# Altium footprint library aiskylab-01Resistors.PcbLib: 208 footprints (part 13 of 13)
Each footprint in its own frame and in the unit in brackets; x right, y up, seen from the top. Pads: shape width x height; smd on the part's side, far side on the other; paste and mask are expansions set on the pad; w line width, h text height; cw(c..) or ccw(c..) is an arc to the next point about the centre after c.
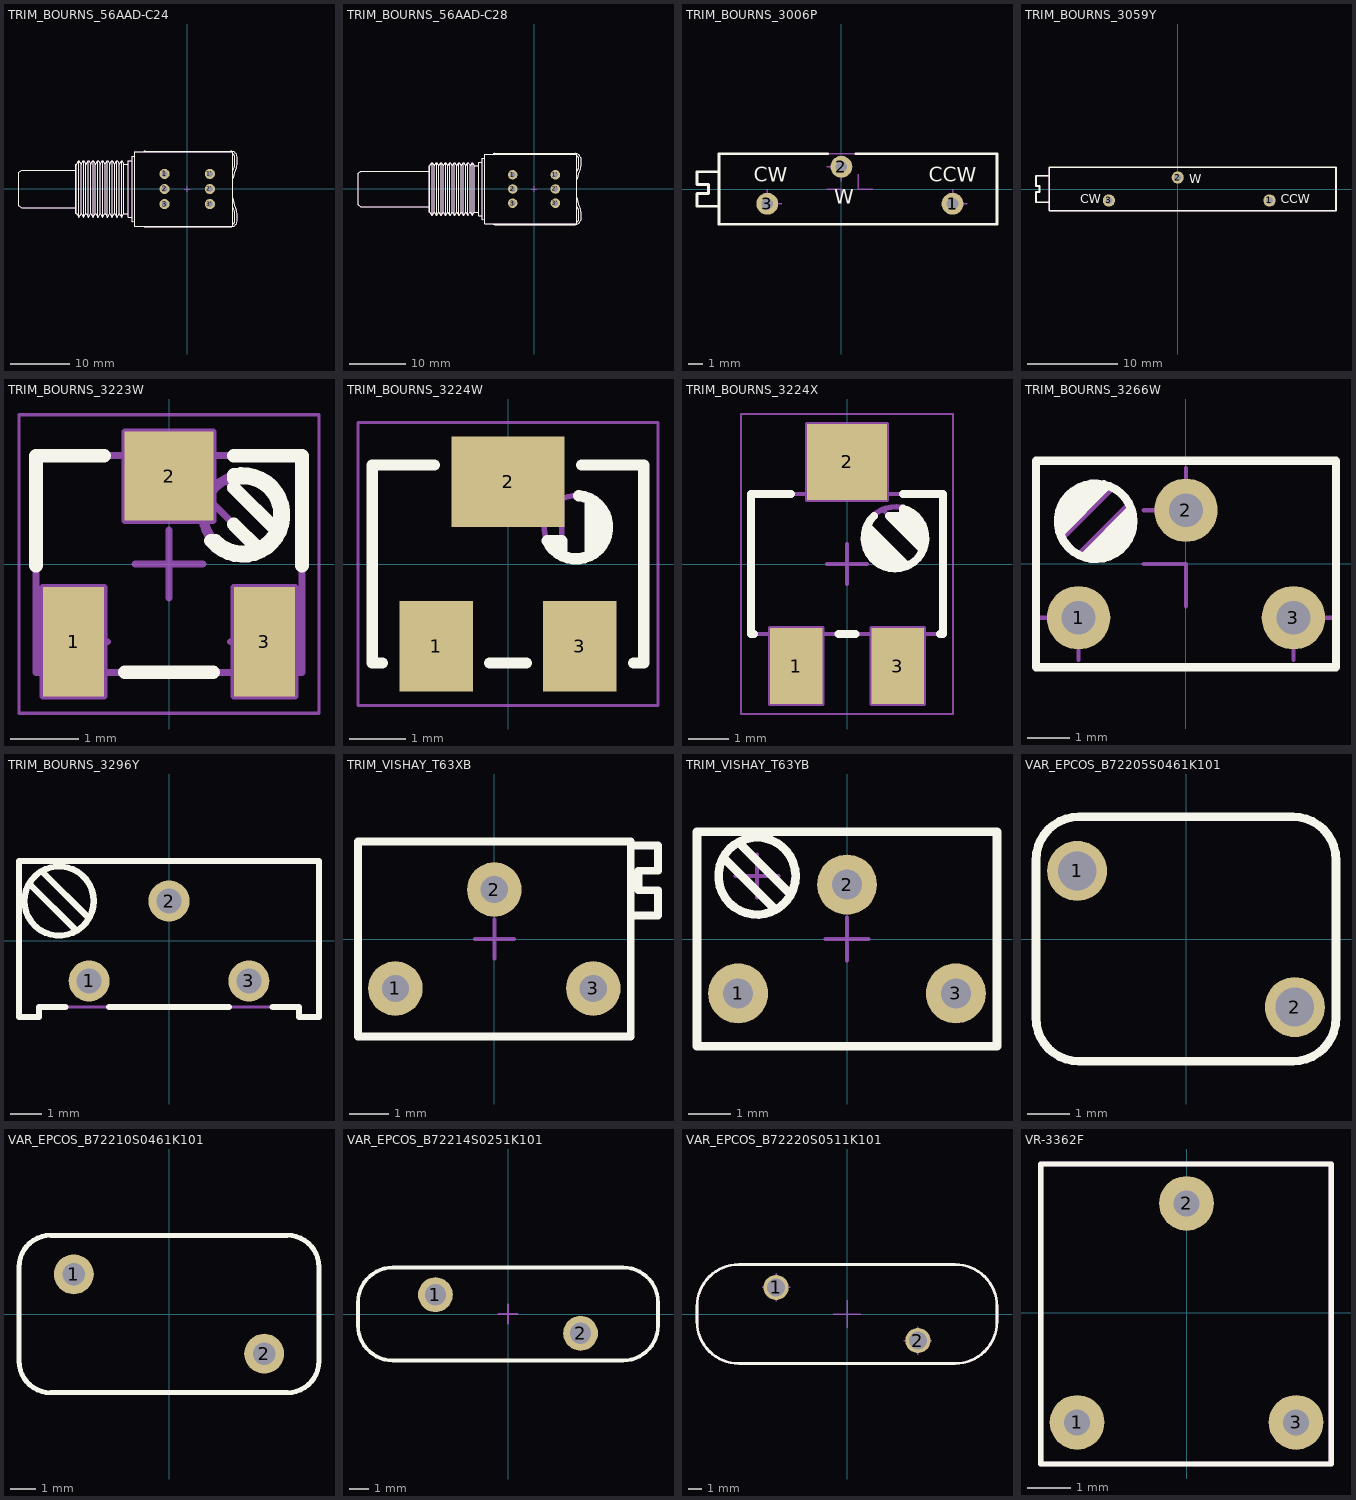
[diagram p12: the footprints below, top view; thin cyan lines are the x and y axes]

## TRIM_BOURNS_56AAD-C24 [mm] "Panel Control Trimming Potentiometer with Rotary (Clock Wise) SPDT Switch, Serie 56"
height 13.25
pads (6):
  round 1.7 hole 1: 1(-3.81,2.54) 1'(3.81,2.54) 2(-3.81,0) 2'(3.81,0) 3(-3.81,-2.54) 3'(3.81,-2.54)
Top Overlay:
  lines w0.2: -18.773,-4.125 -18.773,4.125 ; -18.653,-4.125 -18.603,-4.125 -18.253,-4.725 -18.203,-4.725 -17.853,-4.125 -17.803,-4.125 -17.453,-4.725 -17.403,-4.725 -17.053,-4.125 -17.003,-4.125 -16.653,-4.725 -16.603,-4.725 -16.253,-4.125 -16.203,-4.125 -15.853,-4.725 -15.803,-4.725 -15.453,-4.125 -15.403,-4.125 -15.053,-4.725 -15.003,-4.725 -14.653,-4.125 -14.603,-4.125 -14.253,-4.725 -14.203,-4.725 -13.853,-4.125 -13.803,-4.125 -13.453,-4.725 -13.403,-4.725 -13.053,-4.125 -13.003,-4.125 -12.653,-4.725 -12.603,-4.725 -12.253,-4.125 -12.203,-4.125 -11.853,-4.725 -11.803,-4.725 -11.453,-4.125 -11.403,-4.125 -11.053,-4.725 -11.003,-4.725 -10.653,-4.125 ; -18.653,4.125 -18.603,4.125 -18.253,4.725 -18.203,4.725 -17.853,4.125 -17.803,4.125 -17.453,4.725 -17.403,4.725 -17.053,4.125 -17.003,4.125 -16.653,4.725 -16.603,4.725 -16.253,4.125 -16.203,4.125 -15.853,4.725 -15.803,4.725 -15.453,4.125 -15.403,4.125 -15.053,4.725 -15.003,4.725 -14.653,4.125 -14.603,4.125 -14.253,4.725 -14.203,4.725 -13.853,4.125 -13.803,4.125 -13.453,4.725 -13.403,4.725 -13.053,4.125 -13.003,4.125 -12.653,4.725 -12.603,4.725 -12.253,4.125 -12.203,4.125 -11.853,4.725 -11.803,4.725 -11.453,4.125 -11.403,4.125 -11.053,4.725 -11.003,4.725 -10.653,4.125 ; -18.628,-4.125 -18.628,4.125 ; -18.228,-4.725 -18.228,4.725 ; -17.828,-4.125 -17.828,4.125 ; -17.428,-4.725 -17.428,4.725 ; -17.028,-4.125 -17.028,4.125 ; -16.628,-4.725 -16.628,4.725 ; -16.228,-4.125 -16.228,4.125 ; -15.828,-4.725 -15.828,4.725 ; -15.428,-4.125 -15.428,4.125 ; -15.028,-4.725 -15.028,4.725 ; -14.628,-4.125 -14.628,4.125 ; -14.228,-4.725 -14.228,4.725 ; -13.828,-4.125 -13.828,4.125 ; -13.428,-4.725 -13.428,4.725 ; -13.028,-4.125 -13.028,4.125 ; -12.628,-4.725 -12.628,4.725 ; -12.228,-4.125 -12.228,4.125 ; -11.828,-4.725 -11.828,4.725 ; -11.428,-4.125 -11.428,4.125 ; -11.028,-4.725 -11.028,4.725 ; -9.891,-4.178 -10.653,-4.178 -10.653,4.178 -9.891,4.178 ; -9.256,-4.763 -9.891,-4.763 -9.891,4.762 -9.256,4.762 ; -8.837,-5.447 -9.243,-5.512 -9.243,5.512 -8.837,5.512 ; -7.33,-6.248 ccw(c-7.052,-5.918) -7.052,-6.35 7.354,-6.35 ccw(c7.354,-5.294) 8.41,-5.294 8.41,-4.315 ccw(c6.53,-4.315) 8.246,-3.547 cw(c14.706,-0.656) 7.733,-1.87 7.673,-1.524 ; -7.33,6.248 cw(c-7.052,5.918) -7.052,6.35 7.354,6.35 cw(c7.354,5.294) 8.41,5.294 8.41,4.315 cw(c6.53,4.315) 8.246,3.547 ccw(c14.706,0.656) 7.733,1.87 7.673,1.524 ; 7.673,-5.889 ccw(c7.354,-5.294) 8.029,-5.294 8.029,-4.315 ccw(c6.53,-4.315) 7.898,-3.702 cw(c14.706,-0.656) 7.673,-3.14 ; 7.673,3.14 cw(c14.706,0.656) 7.898,3.702 ccw(c6.53,4.315) 8.029,4.315 8.029,5.294 ccw(c7.354,5.294) 7.673,5.889 ; -28.293,-2.821 -28.293,2.821 -27.793,3.175 -18.773,3.175 -18.773,-3.175 -27.793,-3.175 -28.293,-2.821 ; -8.837,-6.248 -8.837,6.248 7.673,6.248 7.673,-6.248 -8.837,-6.248
Top Designator:
  text ".Designator" at -17.559,-0.508 h1.52
Top Assembly:
  lines w0.1: -18.773,-4.125 -18.773,4.125 ; -18.653,-4.125 -18.603,-4.125 -18.253,-4.725 -18.203,-4.725 -17.853,-4.125 -17.803,-4.125 -17.453,-4.725 -17.403,-4.725 -17.053,-4.125 -17.003,-4.125 -16.653,-4.725 -16.603,-4.725 -16.253,-4.125 -16.203,-4.125 -15.853,-4.725 -15.803,-4.725 -15.453,-4.125 -15.403,-4.125 -15.053,-4.725 -15.003,-4.725 -14.653,-4.125 -14.603,-4.125 -14.253,-4.725 -14.203,-4.725 -13.853,-4.125 -13.803,-4.125 -13.453,-4.725 -13.403,-4.725 -13.053,-4.125 -13.003,-4.125 -12.653,-4.725 -12.603,-4.725 -12.253,-4.125 -12.203,-4.125 -11.853,-4.725 -11.803,-4.725 -11.453,-4.125 -11.403,-4.125 -11.053,-4.725 -11.003,-4.725 -10.653,-4.125 ; -18.653,4.125 -18.603,4.125 -18.253,4.725 -18.203,4.725 -17.853,4.125 -17.803,4.125 -17.453,4.725 -17.403,4.725 -17.053,4.125 -17.003,4.125 -16.653,4.725 -16.603,4.725 -16.253,4.125 -16.203,4.125 -15.853,4.725 -15.803,4.725 -15.453,4.125 -15.403,4.125 -15.053,4.725 -15.003,4.725 -14.653,4.125 -14.603,4.125 -14.253,4.725 -14.203,4.725 -13.853,4.125 -13.803,4.125 -13.453,4.725 -13.403,4.725 -13.053,4.125 -13.003,4.125 -12.653,4.725 -12.603,4.725 -12.253,4.125 -12.203,4.125 -11.853,4.725 -11.803,4.725 -11.453,4.125 -11.403,4.125 -11.053,4.725 -11.003,4.725 -10.653,4.125 ; -18.628,-4.125 -18.628,4.125 ; -18.228,-4.725 -18.228,4.725 ; -17.828,-4.125 -17.828,4.125 ; -17.428,-4.725 -17.428,4.725 ; -17.028,-4.125 -17.028,4.125 ; -16.628,-4.725 -16.628,4.725 ; -16.228,-4.125 -16.228,4.125 ; -15.828,-4.725 -15.828,4.725 ; -15.428,-4.125 -15.428,4.125 ; -15.028,-4.725 -15.028,4.725 ; -14.628,-4.125 -14.628,4.125 ; -14.228,-4.725 -14.228,4.725 ; -13.828,-4.125 -13.828,4.125 ; -13.428,-4.725 -13.428,4.725 ; -13.028,-4.125 -13.028,4.125 ; -12.628,-4.725 -12.628,4.725 ; -12.228,-4.125 -12.228,4.125 ; -11.828,-4.725 -11.828,4.725 ; -11.428,-4.125 -11.428,4.125 ; -11.028,-4.725 -11.028,4.725 ; -9.891,-4.178 -10.653,-4.178 -10.653,4.178 -9.891,4.178 ; -9.256,-4.763 -9.891,-4.763 -9.891,4.762 -9.256,4.762 ; -8.837,-5.447 -9.243,-5.512 -9.243,5.512 -8.837,5.512 ; -7.33,-6.248 ccw(c-7.052,-5.918) -7.052,-6.35 7.354,-6.35 ccw(c7.354,-5.294) 8.41,-5.294 8.41,-4.315 ccw(c6.53,-4.315) 8.246,-3.547 cw(c14.706,-0.656) 7.733,-1.87 7.673,-1.524 ; -7.33,6.248 cw(c-7.052,5.918) -7.052,6.35 7.354,6.35 cw(c7.354,5.294) 8.41,5.294 8.41,4.315 cw(c6.53,4.315) 8.246,3.547 ccw(c14.706,0.656) 7.733,1.87 7.673,1.524 ; 7.673,-5.889 ccw(c7.354,-5.294) 8.029,-5.294 8.029,-4.315 ccw(c6.53,-4.315) 7.898,-3.702 cw(c14.706,-0.656) 7.673,-3.14 ; 7.673,3.14 cw(c14.706,0.656) 7.898,3.702 ccw(c6.53,4.315) 8.029,4.315 8.029,5.294 ccw(c7.354,5.294) 7.673,5.889 ; -28.293,-2.821 -27.793,-3.175 -18.773,-3.175 -18.773,3.175 -27.793,3.175 -28.293,2.821 -28.293,-2.821 ; -8.837,-6.248 -8.837,6.248 7.673,6.248 7.673,-6.248 -8.837,-6.248
Top Dimensions:
  lines w0.1: -4.31,-2.54 -3.81,-2.54 ; -4.31,-0.001 -3.81,-0.001 ; -4.31,2.54 -3.81,2.54 ; -3.81,-3.04 -3.81,-2.54 ; -3.81,-2.04 -3.81,-2.54 ; -3.81,-0.501 -3.81,-0.001 ; -3.81,0.499 -3.81,-0.001 ; -3.81,2.04 -3.81,2.54 ; -3.81,3.04 -3.81,2.54 ; -3.31,-2.54 -3.81,-2.54 ; -3.31,-0.001 -3.81,-0.001 ; -3.31,2.54 -3.81,2.54 ; -0.5,0 0,0 ; 0,-0.5 0,0 ; 0,0.5 0,0 ; 0.5,0 0,0 ; 3.31,-2.54 3.81,-2.54 ; 3.31,-0.001 3.81,-0.001 ; 3.31,2.54 3.81,2.54 ; 3.81,-3.04 3.81,-2.54 ; 3.81,-2.04 3.81,-2.54 ; 3.81,-0.501 3.81,-0.001 ; 3.81,0.499 3.81,-0.001 ; 3.81,2.04 3.81,2.54 ; 3.81,3.04 3.81,2.54 ; 4.31,-2.54 3.81,-2.54 ; 4.31,-0.001 3.81,-0.001 ; 4.31,2.54 3.81,2.54
3D body "TRIM_BOURNS_56AAD-C24_Part2.stp": height 14.09, standoff -0.12, extent -12.582,-6.772 -9.241,6.772
3D body "TRIM_BOURNS_56AAD-C24_Part1.stp": height 13.23, standoff -6.9, extent -28.293,-6.35 8.41,6.35

## TRIM_BOURNS_56AAD-C28 [mm] "Panel Control Trimming Potentiometer with Rotary (Clock Wise) SPDT Switch, Serie 56"
height 13.25
pads (6):
  round 1.7 hole 1: 1(-3.81,2.54) 1'(3.81,2.54) 2(-3.81,0) 2'(3.81,0) 3(-3.81,-2.54) 3'(3.81,-2.54)
Top Overlay:
  lines w0.2: -18.773,-4.125 -18.773,4.125 ; -18.653,-4.125 -18.603,-4.125 -18.253,-4.725 -18.203,-4.725 -17.853,-4.125 -17.803,-4.125 -17.453,-4.725 -17.403,-4.725 -17.053,-4.125 -17.003,-4.125 -16.653,-4.725 -16.603,-4.725 -16.253,-4.125 -16.203,-4.125 -15.853,-4.725 -15.803,-4.725 -15.453,-4.125 -15.403,-4.125 -15.053,-4.725 -15.003,-4.725 -14.653,-4.125 -14.603,-4.125 -14.253,-4.725 -14.203,-4.725 -13.853,-4.125 -13.803,-4.125 -13.453,-4.725 -13.403,-4.725 -13.053,-4.125 -13.003,-4.125 -12.653,-4.725 -12.603,-4.725 -12.253,-4.125 -12.203,-4.125 -11.853,-4.725 -11.803,-4.725 -11.453,-4.125 -11.403,-4.125 -11.053,-4.725 -11.003,-4.725 -10.653,-4.125 ; -18.653,4.125 -18.603,4.125 -18.253,4.725 -18.203,4.725 -17.853,4.125 -17.803,4.125 -17.453,4.725 -17.403,4.725 -17.053,4.125 -17.003,4.125 -16.653,4.725 -16.603,4.725 -16.253,4.125 -16.203,4.125 -15.853,4.725 -15.803,4.725 -15.453,4.125 -15.403,4.125 -15.053,4.725 -15.003,4.725 -14.653,4.125 -14.603,4.125 -14.253,4.725 -14.203,4.725 -13.853,4.125 -13.803,4.125 -13.453,4.725 -13.403,4.725 -13.053,4.125 -13.003,4.125 -12.653,4.725 -12.603,4.725 -12.253,4.125 -12.203,4.125 -11.853,4.725 -11.803,4.725 -11.453,4.125 -11.403,4.125 -11.053,4.725 -11.003,4.725 -10.653,4.125 ; -18.628,-4.125 -18.628,4.125 ; -18.228,-4.725 -18.228,4.725 ; -17.828,-4.125 -17.828,4.125 ; -17.428,-4.725 -17.428,4.725 ; -17.028,-4.125 -17.028,4.125 ; -16.628,-4.725 -16.628,4.725 ; -16.228,-4.125 -16.228,4.125 ; -15.828,-4.725 -15.828,4.725 ; -15.428,-4.125 -15.428,4.125 ; -15.028,-4.725 -15.028,4.725 ; -14.628,-4.125 -14.628,4.125 ; -14.228,-4.725 -14.228,4.725 ; -13.828,-4.125 -13.828,4.125 ; -13.428,-4.725 -13.428,4.725 ; -13.028,-4.125 -13.028,4.125 ; -12.628,-4.725 -12.628,4.725 ; -12.228,-4.125 -12.228,4.125 ; -11.828,-4.725 -11.828,4.725 ; -11.428,-4.125 -11.428,4.125 ; -11.028,-4.725 -11.028,4.725 ; -9.891,-4.178 -10.653,-4.178 -10.653,4.178 -9.891,4.178 ; -9.256,-4.763 -9.891,-4.763 -9.891,4.762 -9.256,4.762 ; -8.837,-5.447 -9.243,-5.512 -9.243,5.512 -8.837,5.512 ; -7.33,-6.248 ccw(c-7.052,-5.918) -7.052,-6.35 7.354,-6.35 ccw(c7.354,-5.294) 8.41,-5.294 8.41,-4.315 ccw(c6.53,-4.315) 8.246,-3.547 cw(c14.706,-0.656) 7.733,-1.87 7.673,-1.524 ; -7.33,6.248 cw(c-7.052,5.918) -7.052,6.35 7.354,6.35 cw(c7.354,5.294) 8.41,5.294 8.41,4.315 cw(c6.53,4.315) 8.246,3.547 ccw(c14.706,0.656) 7.733,1.87 7.673,1.524 ; 7.673,-5.889 ccw(c7.354,-5.294) 8.029,-5.294 8.029,-4.315 ccw(c6.53,-4.315) 7.898,-3.702 cw(c14.706,-0.656) 7.673,-3.14 ; 7.673,3.14 cw(c14.706,0.656) 7.898,3.702 ccw(c6.53,4.315) 8.029,4.315 8.029,5.294 ccw(c7.354,5.294) 7.673,5.889 ; -31.473,-2.821 -31.473,2.821 -30.973,3.175 -18.773,3.175 -18.773,-3.175 -30.973,-3.175 -31.473,-2.821 ; -8.837,-6.248 -8.837,6.248 7.673,6.248 7.673,-6.248 -8.837,-6.248
Top Designator:
  text ".Designator" at -19.149,-0.508 h1.52
Top Assembly:
  lines w0.1: -18.773,-4.125 -18.773,4.125 ; -18.653,-4.125 -18.603,-4.125 -18.253,-4.725 -18.203,-4.725 -17.853,-4.125 -17.803,-4.125 -17.453,-4.725 -17.403,-4.725 -17.053,-4.125 -17.003,-4.125 -16.653,-4.725 -16.603,-4.725 -16.253,-4.125 -16.203,-4.125 -15.853,-4.725 -15.803,-4.725 -15.453,-4.125 -15.403,-4.125 -15.053,-4.725 -15.003,-4.725 -14.653,-4.125 -14.603,-4.125 -14.253,-4.725 -14.203,-4.725 -13.853,-4.125 -13.803,-4.125 -13.453,-4.725 -13.403,-4.725 -13.053,-4.125 -13.003,-4.125 -12.653,-4.725 -12.603,-4.725 -12.253,-4.125 -12.203,-4.125 -11.853,-4.725 -11.803,-4.725 -11.453,-4.125 -11.403,-4.125 -11.053,-4.725 -11.003,-4.725 -10.653,-4.125 ; -18.653,4.125 -18.603,4.125 -18.253,4.725 -18.203,4.725 -17.853,4.125 -17.803,4.125 -17.453,4.725 -17.403,4.725 -17.053,4.125 -17.003,4.125 -16.653,4.725 -16.603,4.725 -16.253,4.125 -16.203,4.125 -15.853,4.725 -15.803,4.725 -15.453,4.125 -15.403,4.125 -15.053,4.725 -15.003,4.725 -14.653,4.125 -14.603,4.125 -14.253,4.725 -14.203,4.725 -13.853,4.125 -13.803,4.125 -13.453,4.725 -13.403,4.725 -13.053,4.125 -13.003,4.125 -12.653,4.725 -12.603,4.725 -12.253,4.125 -12.203,4.125 -11.853,4.725 -11.803,4.725 -11.453,4.125 -11.403,4.125 -11.053,4.725 -11.003,4.725 -10.653,4.125 ; -18.628,-4.125 -18.628,4.125 ; -18.228,-4.725 -18.228,4.725 ; -17.828,-4.125 -17.828,4.125 ; -17.428,-4.725 -17.428,4.725 ; -17.028,-4.125 -17.028,4.125 ; -16.628,-4.725 -16.628,4.725 ; -16.228,-4.125 -16.228,4.125 ; -15.828,-4.725 -15.828,4.725 ; -15.428,-4.125 -15.428,4.125 ; -15.028,-4.725 -15.028,4.725 ; -14.628,-4.125 -14.628,4.125 ; -14.228,-4.725 -14.228,4.725 ; -13.828,-4.125 -13.828,4.125 ; -13.428,-4.725 -13.428,4.725 ; -13.028,-4.125 -13.028,4.125 ; -12.628,-4.725 -12.628,4.725 ; -12.228,-4.125 -12.228,4.125 ; -11.828,-4.725 -11.828,4.725 ; -11.428,-4.125 -11.428,4.125 ; -11.028,-4.725 -11.028,4.725 ; -9.891,-4.178 -10.653,-4.178 -10.653,4.178 -9.891,4.178 ; -9.256,-4.763 -9.891,-4.763 -9.891,4.762 -9.256,4.762 ; -8.837,-5.447 -9.243,-5.512 -9.243,5.512 -8.837,5.512 ; -7.33,-6.248 ccw(c-7.052,-5.918) -7.052,-6.35 7.354,-6.35 ccw(c7.354,-5.294) 8.41,-5.294 8.41,-4.315 ccw(c6.53,-4.315) 8.246,-3.547 cw(c14.706,-0.656) 7.733,-1.87 7.673,-1.524 ; -7.33,6.248 cw(c-7.052,5.918) -7.052,6.35 7.354,6.35 cw(c7.354,5.294) 8.41,5.294 8.41,4.315 cw(c6.53,4.315) 8.246,3.547 ccw(c14.706,0.656) 7.733,1.87 7.673,1.524 ; 7.673,-5.889 ccw(c7.354,-5.294) 8.029,-5.294 8.029,-4.315 ccw(c6.53,-4.315) 7.898,-3.702 cw(c14.706,-0.656) 7.673,-3.14 ; 7.673,3.14 cw(c14.706,0.656) 7.898,3.702 ccw(c6.53,4.315) 8.029,4.315 8.029,5.294 ccw(c7.354,5.294) 7.673,5.889 ; -31.473,-2.821 -30.973,-3.175 -18.773,-3.175 -18.773,3.175 -30.973,3.175 -31.473,2.821 -31.473,-2.821 ; -8.837,-6.248 -8.837,6.248 7.673,6.248 7.673,-6.248 -8.837,-6.248
Top Dimensions:
  lines w0.1: -4.31,-2.54 -3.81,-2.54 ; -4.31,-0.001 -3.81,-0.001 ; -4.31,2.54 -3.81,2.54 ; -3.81,-3.04 -3.81,-2.54 ; -3.81,-2.04 -3.81,-2.54 ; -3.81,-0.501 -3.81,-0.001 ; -3.81,0.499 -3.81,-0.001 ; -3.81,2.04 -3.81,2.54 ; -3.81,3.04 -3.81,2.54 ; -3.31,-2.54 -3.81,-2.54 ; -3.31,-0.001 -3.81,-0.001 ; -3.31,2.54 -3.81,2.54 ; -0.5,0 0,0 ; 0,-0.5 0,0 ; 0,0.5 0,0 ; 0.5,0 0,0 ; 3.31,-2.54 3.81,-2.54 ; 3.31,-0.001 3.81,-0.001 ; 3.31,2.54 3.81,2.54 ; 3.81,-3.04 3.81,-2.54 ; 3.81,-2.04 3.81,-2.54 ; 3.81,-0.501 3.81,-0.001 ; 3.81,0.499 3.81,-0.001 ; 3.81,2.04 3.81,2.54 ; 3.81,3.04 3.81,2.54 ; 4.31,-2.54 3.81,-2.54 ; 4.31,-0.001 3.81,-0.001 ; 4.31,2.54 3.81,2.54
3D body "TRIM_BOURNS_56AAD-C28_Part2.stp": height 14.09, standoff -0.12, extent -12.582,-6.772 -9.241,6.772
3D body "TRIM_BOURNS_56AAD-C28_Part1.stp": height 13.23, standoff -6.9, extent -31.473,-6.35 8.41,6.35

## TRIM_BOURNS_3006P [mm] "Trimming Potentiometer BOURNS 3006P Series"
height 6.35
pads (3):
  round 1.5 hole 0.8: 1(7.62,-1.015) 2(0,1.525) 3(-5.08,-1.015)
Top Overlay:
  lines w0.2: -8.38,-1.18 -9.9,-1.18 -9.9,-0.32 -9.11,-0.32 -9.11,0.32 -9.9,0.32 -9.9,1.18 -8.38,1.18 ; -0.95,2.415 -8.38,2.415 -8.38,-2.415 10.67,-2.415 10.67,2.415 1,2.415
  text "CCW" at 6,0.5 h1
  text "W" at -0.5,-1 h1
  text "CW" at -6,0.5 h1
Top Designator:
  text ".Designator" at -7.233,-0.508 h1.52
Top Assembly:
  lines w0.1: -8.38,-1.18 -9.9,-1.18 -9.9,-0.32 -9.11,-0.32 -9.11,0.32 -9.9,0.32 -9.9,1.18 -8.38,1.18 ; -8.38,-2.415 -8.38,2.415 10.67,2.415 10.67,-2.415 -8.38,-2.415
  text "CW" at -6,0.5 h1
  text "W" at -0.5,-1 h1
  text "CCW" at 6,0.5 h1
Top Dimensions:
  circle w0.1: c7.62,-1.015 r0.27
  circle w0.1: c-5.08,-1.015 r0.27
  circle w0.1: c0,1.525 r0.27
  lines w0.1: -5.08,-0.015 -5.08,-1.015 -4.08,-1.015 ; -1,0 0,0 0,-1 ; -1,1.525 0,1.525 0,0.525 ; 1.145,1 1.145,0 2.145,0 ; 7.62,-0.015 7.62,-1.015 8.62,-1.015
3D body "TRIM_BOURNS_3006P.stp": height 6.35, standoff -3.1, extent -9.9,-2.415 10.67,2.415

## TRIM_BOURNS_3059Y [mm] "Trimming Potentiometer BOURNS 3059 Series"
height 8.38
pads (3):
  round 1.35 hole 0.8: 1(10.16,-1.27) 2(0,1.27) 3(-7.62,-1.27)
Top Overlay:
  lines w0.2: -14.22,-1.46 -15.69,-1.46 ; -14.22,1.46 -15.69,1.46 -15.69,0.32 -15.295,0.32 -15.295,-0.32 -15.69,-0.32 ; -15.69,-1.46 -15.69,-0.32 ; -15.69,-1.46 -15.69,-0.32 ; -14.22,-2.415 -14.22,2.415 17.53,2.415 17.53,-2.415 -14.22,-2.415
  text "CW" at -10.795,-1.587 h1
  text "W" at 1.27,0.635 h1
  text "CCW" at 11.43,-1.587 h1
Top Designator:
  text ".Designator" at -6.927,-0.508 h1.52
Top Assembly:
  lines w0.1: -14.22,-1.46 -15.69,-1.46 -15.69,-0.32 -15.295,-0.32 -15.295,0.32 -15.69,0.32 -15.69,1.46 -14.22,1.46 ; -14.22,-2.415 -14.22,2.415 17.53,2.415 17.53,-2.415 -14.22,-2.415
3D body "TRIM_BOURNS_3059Y.stp": height 8.38, standoff -3.8, extent -16.25,-2.415 17.53,2.415

## TRIM_BOURNS_3223W [mm] "Bourns 3223W Trimming Potentiometer"
height 4.16
pads (3):
  rect 0.9x1.6 smd: 1(-1.4,-1.14) 3(1.4,-1.14)
  rect 1.3x1.3 smd: 2(0,1.29)
Top Overlay:
  lines w0.2: -1.95,-0.025 -1.95,1.59 -0.95,1.59 ; -0.65,-1.59 0.65,-1.59 ; 0.616,0.34 ccw(c1.08,0.72) 0.95,1.306 ; 0.682,0.34 ccw(c1.08,0.72) 0.95,1.254 ; 0.95,0.581 1.311,0.221 ; 0.95,1.119 1.579,0.489 ; 0.95,1.59 1.95,1.59 1.95,-0.025
Top Designator:
  text ".Designator" at -7.618,-0.508 h1.52
Top Assembly:
  circle w0.1: c1.08,0.72 r0.55
  circle w0.1: c1.08,0.72 r0.6
  lines w0.1: -1.66,-1.59 -1.66,-1.807 -1.1,-1.81 -1.1,-1.59 ; -0.49,1.59 -0.49,1.81 0.49,1.81 0.49,1.59 ; 0.581,0.951 1.311,0.221 ; 0.849,1.219 1.579,0.489 ; 1.1,-1.59 1.1,-1.81 1.66,-1.81 1.66,-1.59 ; -1.95,-1.59 -1.95,1.59 1.95,1.59 1.95,-1.59 -1.95,-1.59
Top Dimensions:
  lines w0.1: -1.9,-1.14 -1.4,-1.14 ; -1.4,-1.64 -1.4,-1.14 ; -1.4,-0.64 -1.4,-1.14 ; -0.9,-1.14 -1.4,-1.14 ; -0.5,0 0,0 ; -0.5,1.29 0,1.29 ; 0,-0.5 0,0 ; 0,0.5 0,0 ; 0,0.79 0,1.29 ; 0,1.79 0,1.29 ; 0.5,0 0,0 ; 0.5,1.29 0,1.29 ; 0.9,-1.14 1.4,-1.14 ; 1.4,-1.64 1.4,-1.14 ; 1.4,-0.64 1.4,-1.14 ; 1.9,-1.14 1.4,-1.14 ; -1.85,-1.94 -1.85,-0.34 -0.95,-0.34 -0.95,-1.94 -1.85,-1.94 ; -0.65,0.64 0.65,0.64 0.65,1.94 -0.65,1.94 -0.65,0.64 ; 0.95,-1.94 0.95,-0.34 1.85,-0.34 1.85,-1.94 0.95,-1.94
Bottom 3D Body:
  lines w0.05: -2.2,-2.19 2.2,-2.19 2.2,2.19 -2.2,2.19 -2.2,-2.19
3D body "p160-100.stp": height 0.02, standoff 0, extent -1.85,-1.95 -0.85,-0.35
3D body "p160-100.stp": height 0.02, standoff 0, extent 0.85,-1.95 1.85,-0.35
3D body "p130-130.stp": height 0.02, standoff 0, extent -0.65,0.64 0.65,1.94
3D body "TRIM_BOURNS_3223W.stp": height 4.16, standoff 0, extent -1.95,-1.81 1.95,1.81

## TRIM_BOURNS_3224W [mm] "Bourns 3224W Trimming Potentiometer"
height 5.1
pads (3):
  rect 1.3x1.6 smd: 1(-1.27,-1.45) 3(1.27,-1.45)
  rect 2x1.6 smd: 2(0,1.45)
Top Overlay:
  lines w0.2: -2.22,-1.75 -2.4,-1.75 -2.4,1.75 -1.3,1.75 ; -0.32,-1.75 0.32,-1.75 ; 0.694,0.411 ccw(c1.2,0.65) 1.25,1.208 ; 0.7,0.41 0.95,0.41 0.95,0.15 ; 0.8,0.3 0.8,0.41 ; 1.3,1.75 2.4,1.75 2.4,-1.75 2.22,-1.75 ; 1.45,0.15 1.45,1.15 ; 1.6,0.3 1.6,1
Top Designator:
  text ".Designator" at -7.618,-0.508 h1.52
Top Assembly:
  lines w0.1: -2.22,-1.75 -2.4,-1.75 -2.4,1.75 -1.3,1.75 ; -0.32,-1.75 0.32,-1.75 ; 0.692,0.414 cw(c1.2,0.65) 0.694,0.411 ; 0.95,0.15 0.95,1.15 ; 1.3,1.75 2.4,1.75 2.4,-1.75 2.22,-1.75 ; 1.45,0.15 1.45,1.15
Bottom 3D Body:
  lines w0.05: -2.65,-2.5 -2.65,2.5 2.65,2.5 2.65,-2.5 -2.65,-2.5
3D body "p160-130.stp": height 0.02, standoff 0, extent -1.925,-2.25 -0.625,-0.65
3D body "p160-130.stp": height 0.02, standoff 0, extent 0.625,-2.25 1.925,-0.65
3D body "p200-160.stp": height 0.02, standoff 0, extent -1,0.65 1,2.25
3D body "TRIM_BOURNS_3224W.stp": height 5.3, standoff 0, extent -2.4,-1.95 2.4,1.95

## TRIM_BOURNS_3224X [mm] "Bourns 3224X Trimming Potentiometer"
height 5.3
pads (3):
  rect 1.32x1.9 smd: 1(-1.27,-2.55) 3(1.27,-2.55)
  rect 2x1.9 smd: 2(0,2.55)
Top Overlay:
  lines w0.2: -2.33,-1.75 -2.4,-1.75 -2.4,1.75 -1.4,1.75 ; -0.21,-1.75 0.21,-1.75 ; 0.45,0.725 1.275,-0.1 ; 0.475,0.45 1,-0.075 ; 0.502,0.952 1.502,-0.048 ; 0.675,1.2 ccw(c1.2,0.65) 1.4,1.383 1.4,1.2 ; 1.396,1.379 1.925,0.85 ; 1.4,1.75 2.4,1.75 2.4,-1.75 2.33,-1.75 ; 1.898,0.348 1.046,1.2 1.325,1.2 1.95,0.575
Top Designator:
  text ".Designator" at -7.618,-0.508 h1.52
Top Assembly:
  circle w0.1: c1.2,0.65 r0.76
  circle w0.1: c1.2,0.65 r0.8
  lines w0.1: -1.65,-1.75 -1.65,-2.85 -0.85,-2.85 -0.85,-1.75 ; -0.65,1.75 -0.65,2.85 0.65,2.85 0.65,1.75 ; 0.502,0.952 1.502,-0.048 ; 0.85,-1.75 0.85,-2.85 1.65,-2.85 1.65,-1.75 ; 0.898,1.348 1.898,0.348 ; -2.4,-1.75 -2.4,1.75 2.4,1.75 2.4,-1.75 -2.4,-1.75
Top Dimensions:
  lines w0.1: -1.77,-2.55 -1.27,-2.55 ; -1.27,-3.05 -1.27,-2.55 ; -1.27,-2.05 -1.27,-2.55 ; -0.77,-2.55 -1.27,-2.55 ; -0.5,0 0,0 ; -0.5,2.55 0,2.55 ; 0,-0.5 0,0 ; 0,0.5 0,0 ; 0,2.05 0,2.55 ; 0,3.05 0,2.55 ; 0.5,0 0,0 ; 0.5,2.55 0,2.55 ; 0.77,-2.55 1.27,-2.55 ; 1.27,-3.05 1.27,-2.55 ; 1.27,-2.05 1.27,-2.55 ; 1.77,-2.55 1.27,-2.55 ; -1.93,-3.5 -0.61,-3.5 -0.61,-1.6 -1.93,-1.6 -1.93,-3.5 ; -1,1.6 1,1.6 1,3.5 -1,3.5 -1,1.6 ; 0.61,-3.5 1.93,-3.5 1.93,-1.6 0.61,-1.6 0.61,-3.5
Bottom 3D Body:
  lines w0.05: -2.65,-3.75 2.65,-3.75 2.65,3.75 -2.65,3.75 -2.65,-3.75
3D body "p190-132.stp": height 0.02, standoff 0, extent -1.935,-3.5 -0.615,-1.6
3D body "p190-132.stp": height 0.02, standoff 0, extent 0.615,-3.5 1.935,-1.6
3D body "p200-190.stp": height 0.02, standoff 0, extent -1,1.6 1,3.5
3D body "TRIM_BOURNS_3224X.stp": height 5.3, standoff 0, extent -2.4,-2.85 2.4,2.85

## TRIM_BOURNS_3266W [mm] "Trimming Potentiometer BOURNS 3266W Series"
height 7.75
pads (3):
  round 1.5 hole 0.8: 1(-2.54,-1.27) 2(0,1.27) 3(2.54,-1.27)
Top Overlay:
  circle w0.2: c-2.135,1.01 r0.89
  lines w0.2: -3.012,1.088 -2.228,1.878 ; -3,0.9 -2.028,1.878 ; -2.962,0.737 -1.865,1.84 ; -2.953,1.353 -2.503,1.803 ; -2.405,0.18 -1.308,1.283 ; -2.242,0.142 -1.27,1.12 ; -2.042,0.142 -1.258,0.933 ; -1.767,0.217 -1.317,0.667 ; -3.545,-2.44 -3.545,2.44 3.545,2.44 3.545,-2.44 -3.545,-2.44
Top Designator:
  text ".Designator" at -7.618,-0.508 h1.52
Top Assembly:
  circle w0.1: c-2.135,1.01 r0.89
  lines w0.1: -2.918,0.587 -1.712,1.793 ; -2.558,0.227 -1.352,1.433 ; -3.545,-2.44 -3.545,2.44 3.545,2.44 3.545,-2.44 -3.545,-2.44
Top Dimensions:
  circle w0.1: c0,1.27 r0.245
  circle w0.1: c-2.54,-1.27 r0.245
  circle w0.1: c2.54,-1.27 r0.245
  lines w0.1: -3.54,-1.27 -2.54,-1.27 -2.54,-2.27 ; -1,0 0,0 0,-1 ; -1,1.27 0,1.27 0,2.27 ; 2.54,-2.27 2.54,-1.27 3.54,-1.27
3D body "TRIM_BOURNS_3266W.stp": height 8.77, standoff -3.1, extent -3.545,-2.44 3.545,2.44

## TRIM_BOURNS_3296Y [mm] "Trimming Potentiometer BOURNS 3296Y Series"
height 11.55
pads (3):
  round 1.3 hole 0.8: 1(-2.54,-1.27) 2(0,1.27) 3(2.54,-1.27)
Top Overlay:
  circle w0.2: c-3.493,1.27 r1.1
  lines w0.2: -4.443,1.823 -2.939,0.319 ; -4.046,2.221 -2.542,0.717 ; -3.3,-2.095 -4.127,-2.095 -4.127,-2.413 -4.763,-2.413 -4.763,2.54 4.763,2.54 4.763,-2.413 4.127,-2.413 4.127,-2.095 3.3,-2.095 ; -1.9,-2.095 1.9,-2.095
Top Designator:
  text ".Designator" at -7.618,-0.444 h1.52
Top Assembly:
  circle w0.1: c-3.493,1.27 r1.1
  lines w0.1: -4.765,2.54 4.765,2.54 ; -4.763,2.54 -4.763,-2.413 -4.129,-2.413 ; -4.443,1.823 -2.939,0.319 ; -4.127,-2.413 -4.127,-2.095 4.127,-2.095 4.127,-2.413 4.763,-2.413 ; -4.046,2.221 -2.542,0.717 ; 4.763,-2.095 4.763,-2.412 ; 4.763,2.54 4.763,-2.413
3D body "TRIM_BOURNS_3296Y.stp": height 11.55, standoff -3.42, extent -4.765,-2.41 4.765,2.55

## TRIM_VISHAY_T63XB [mm] "Trimming Potentiometer VISHAY T63YB Series (Side Adjustment)"
height 7
pads (3):
  round 1.4 hole 0.7: 1(-2.54,-1.27) 2(0,1.27) 3(2.54,-1.27)
Top Overlay:
  lines w0.2: 3.5,0.6 4.2,0.6 4.2,1.25 3.7,1.25 3.7,1.75 4.2,1.75 4.2,2.4 3.5,2.4 ; -3.5,-2.5 -3.5,2.5 3.5,2.5 3.5,-2.5 -3.5,-2.5
Top Designator:
  text ".Designator" at -7.268,-0.508 h1.52
Top Dimensions:
  lines w0.1: -3.04,-1.27 -2.54,-1.27 ; -2.54,-1.77 -2.54,-1.27 ; -2.54,-0.77 -2.54,-1.27 ; -2.04,-1.27 -2.54,-1.27 ; -0.5,0 0,0 ; -0.5,1.27 0,1.27 ; 0,-0.5 0,0 ; 0,0.5 0,0 ; 0,0.77 0,1.27 ; 0,1.77 0,1.27 ; 0.5,0 0,0 ; 0.5,1.27 0,1.27 ; 2.04,-1.27 2.54,-1.27 ; 2.54,-1.77 2.54,-1.27 ; 2.54,-0.77 2.54,-1.27 ; 3.04,-1.27 2.54,-1.27
Top 3D Body:
  lines w0.1: 3.5,0.6 4.2,0.6 4.2,1.25 3.7,1.25 3.7,1.75 4.2,1.75 4.2,2.4 3.5,2.4 ; -3.5,-2.5 3.5,-2.5 3.5,2.5 -3.5,2.5 -3.5,-2.5
3D body "TRIM_VISHAY_T63XB.stp": height 7, standoff -3.6, extent -3.5,-2.5 4.2,2.5

## TRIM_VISHAY_T63YB [mm] "Trimming Potentiometer VISHAY T63YB Series (Top Adjustment)"
height 7.7
pads (3):
  round 1.4 hole 0.7: 1(-2.54,-1.27) 2(0,1.27) 3(2.54,-1.27)
Top Overlay:
  circle w0.2: c-2.1,1.47 r0.9
  lines w0.2: -2.888,1.905 -1.665,0.682 ; -2.535,2.258 -1.312,1.035 ; -3.5,-2.5 -3.5,2.5 3.5,2.5 3.5,-2.5 -3.5,-2.5
Top Designator:
  text ".Designator" at -7.618,-0.508 h1.52
Top Assembly:
  circle w0.1: c-2.1,1.47 r0.9
  lines w0.1: -2.888,1.905 -1.665,0.682 ; -2.535,2.258 -1.312,1.035 ; -3.5,-2.5 3.5,-2.5 3.5,2.5 -3.5,2.5 -3.5,-2.5
Top Dimensions:
  lines w0.1: -3.04,-1.27 -2.54,-1.27 ; -2.6,1.47 -2.1,1.47 ; -2.54,-1.77 -2.54,-1.27 ; -2.54,-0.77 -2.54,-1.27 ; -2.1,0.97 -2.1,1.47 ; -2.1,1.97 -2.1,1.47 ; -2.04,-1.27 -2.54,-1.27 ; -1.6,1.47 -2.1,1.47 ; -0.5,0 0,0 ; -0.5,1.27 0,1.27 ; 0,-0.5 0,0 ; 0,0.5 0,0 ; 0,0.77 0,1.27 ; 0,1.77 0,1.27 ; 0.5,0 0,0 ; 0.5,1.27 0,1.27 ; 2.04,-1.27 2.54,-1.27 ; 2.54,-1.77 2.54,-1.27 ; 2.54,-0.77 2.54,-1.27 ; 3.04,-1.27 2.54,-1.27
3D body "TRIM_VISHAY_T63YB.stp": height 7.5, standoff -3.6, extent -3.4,-2.5 3.4,2.5

## VAR_EPCOS_B72205S0461K101 [mm] "EPCOS S05K460 Metal Oxyde Varistor, Body 7x5.7mm"
height 9
pads (2):
  round 1.4 hole 0.9: 1(-2.54,1.587) 2(2.54,-1.587)
Top Overlay:
  lines w0.2: -3.5,-1.85 ccw(c-2.5,-1.85) -2.5,-2.85 2.5,-2.85 ccw(c2.5,-1.85) 3.5,-1.85 3.5,1.85 ccw(c2.5,1.85) 2.5,2.85 -2.5,2.85 ccw(c-2.5,1.85) -3.5,1.85 -3.5,-1.85
Top Designator:
  text ".Designator" at -7.618,-0.508 h1.52
Top Assembly:
  lines w0.1: -3.5,-1.85 ccw(c-2.5,-1.85) -2.5,-2.85 2.5,-2.85 ccw(c2.5,-1.85) 3.5,-1.85 3.5,1.85 ccw(c2.5,1.85) 2.5,2.85 -2.5,2.85 ccw(c-2.5,1.85) -3.5,1.85 -3.5,-1.85
Bottom Value:
  circle w0.254: c-2.54,1.587 r0.3
3D body: height 6, standoff -3.8, extent -2.839,1.288 -2.241,1.887
3D body: height 6, standoff -3.8, extent 2.241,-1.887 2.839,-1.288
3D body "v200-130.stp": height 0.02, standoff -1.65, extent -3.475,0.525 -1.475,2.525
3D body "v200-130.stp": height 0.02, standoff -1.65, extent 1.54,-2.587 3.54,-0.587
3D body "VAR_EPCOS_B72205S0461K101.stp": height 9, standoff -3.6, extent -3.508,-2.858 3.492,2.842

## VAR_EPCOS_B72210S0461K101 [mm] "EPCOS S10K460 Metal Oxyde Varistor, Body 6.3X12mm"
height 15
pads (2):
  round 1.6 hole 0.9: 1(-3.81,1.587) 2(3.81,-1.587)
Top Overlay:
  lines w0.2: 4.73,-3.15 ccw(c4.73,-1.88) 6,-1.88 6,1.88 ccw(c4.73,1.88) 4.73,3.15 -4.73,3.15 ccw(c-4.73,1.88) -6,1.88 -6,-1.88 ccw(c-4.73,-1.88) -4.73,-3.15 4.75,-3.15
Top Designator:
  text ".Designator" at -7.618,-0.508 h1.52
Top Assembly:
  lines w0.1: -6,-1.88 ccw(c-4.73,-1.88) -4.73,-3.15 4.73,-3.15 ccw(c4.73,-1.88) 6,-1.88 6,1.88 ccw(c4.73,1.88) 4.73,3.15 -4.73,3.15 ccw(c-4.73,1.88) -6,1.88 -6,-1.88
3D body "v200-130.stp": height 0.02, standoff -1.65, extent -4.81,0.588 -2.81,2.588
3D body "v200-130.stp": height 0.02, standoff -1.65, extent 2.81,-2.587 4.81,-0.587
3D body "VAR_EPCOS_B72210S0461K101.stp": height 15, standoff -3.6, extent -6,-3.15 6,3.15

## VAR_EPCOS_B72214S0251K101 [mm] "EPCOS B72214S0251K101 Metal Oxyde Varistor, 14mm Body Diameter"
height 18.5
pads (2):
  round 1.8 hole 1.1: 1(-3.75,1) 2(3.75,-1)
Top Overlay:
  lines w0.2: -7.75,-0.6 ccw(c-5.95,-0.6) -5.95,-2.4 5.95,-2.4 ccw(c5.95,-0.6) 7.75,-0.6 7.75,0.6 ccw(c5.95,0.6) 5.95,2.4 -5.95,2.4 ccw(c-5.95,0.6) -7.75,0.6 -7.75,-0.6
Top Designator:
  text ".Designator" at -7.618,-0.508 h1.52
Top Assembly:
  lines w0.1: -7.75,-0.6 ccw(c-5.95,-0.6) -5.95,-2.4 5.95,-2.4 ccw(c5.95,-0.6) 7.75,-0.6 7.75,0.6 ccw(c5.95,0.6) 5.95,2.4 -5.95,2.4 ccw(c-5.95,0.6) -7.75,0.6 -7.75,-0.6
Top Dimensions:
  lines w0.1: -4.25,1 -3.75,1 ; -3.75,0.5 -3.75,1 ; -3.75,1.5 -3.75,1 ; -3.25,1 -3.75,1 ; -0.5,0 0,0 ; 0,-0.5 0,0 ; 0,0.5 0,0 ; 0.5,0 0,0 ; 3.25,-1 3.75,-1 ; 3.75,-1.5 3.75,-1 ; 3.75,-0.5 3.75,-1 ; 4.25,-1 3.75,-1
3D body "VAR_EPCOS_B72214S0251K101.stp": height 18.5, standoff -3.6, extent -7.75,-2.4 7.75,2.4
3D body "v200-130.stp": height 0.02, standoff -1.65, extent 2.75,-2 4.75,0
3D body "v200-130.stp": height 0.02, standoff -1.65, extent -4.75,0 -2.75,2

## VAR_EPCOS_B72220S0511K101 [mm] "EPCOS B72220S0511K101 Metal Oxyde Varistor, Body 7.1X21.5mm"
height 26
pads (2):
  round 1.8 hole 1.3: 1(-5.08,1.905) 2(5.08,-1.905)
Top Overlay:
  lines w0.2: -10.75,-0.55 ccw(c-7.75,-0.55) -7.75,-3.55 7.75,-3.55 ccw(c7.75,-0.55) 10.75,-0.55 10.75,0.55 ccw(c7.75,0.55) 7.75,3.55 -7.75,3.55 ccw(c-7.75,0.55) -10.75,0.55 -10.75,-0.55
Top Designator:
  text ".Designator" at -7.618,-0.508 h1.52
Top Assembly:
  lines w0.2: -10.75,-0.55 ccw(c-7.75,-0.55) -7.75,-3.55 7.75,-3.55 ccw(c7.75,-0.55) 10.75,-0.55 10.75,0.55 ccw(c7.75,0.55) 7.75,3.55 -7.75,3.55 ccw(c-7.75,0.55) -10.75,0.55 -10.75,-0.55
Top Dimensions:
  lines w0.1: -6.08,1.905 -5.08,1.905 ; -5.08,0.905 -5.08,1.905 ; -5.08,2.905 -5.08,1.905 ; -4.08,1.905 -5.08,1.905 ; -1,0 0,0 ; 0,-1 0,0 ; 0,1 0,0 ; 1,0 0,0 ; 4.08,-1.905 5.08,-1.905 ; 5.08,-2.905 5.08,-1.905 ; 5.08,-0.905 5.08,-1.905 ; 6.08,-1.905 5.08,-1.905
3D body "v200-130.stp": height 0.02, standoff -1.65, extent -6.08,0.905 -4.08,2.905
3D body "v200-130.stp": height 0.02, standoff -1.65, extent 4.08,-2.905 6.08,-0.905
3D body "VAR_EPCOS_ B72220S0511K101.stp": height 26, standoff -2.1, extent -10.75,-3.55 10.75,3.55

## VR-3362F [mm]
height 26
pads (3):
  round 1.27 hole 0.6: 1(-2.54,-2.54) 2(0,2.54) 3(2.54,-2.54)
Top Overlay:
  lines w0.127: -3.378,-3.505 -3.378,3.454 3.353,3.454 3.353,-3.505 -3.378,-3.505
Top Designator:
  text ".Designator" at -7.617,-0.522 h1.52
Top Assembly:
  lines w0.127: -3.378,-3.505 3.353,-3.505 3.353,3.454 -3.378,3.454 -3.378,-3.505
3D body "vr-3362.stp": height 4.9, standoff -3, extent -3.425,-3.475 3.425,3.475
3D body "v200-130.stp": height 0.02, standoff -1.65, extent -1,1.54 1,3.54
3D body "v200-130.stp": height 0.02, standoff -1.65, extent 1.54,-3.54 3.54,-1.54
3D body "v200-130.stp": height 0.02, standoff -1.65, extent -3.54,-3.54 -1.54,-1.54